# Altium footprint library CommonFootprints_V1.PcbLib: 80 footprints (part 2 of 5)
Each footprint in its own frame and in the unit in brackets; x right, y up, seen from the top. Pads: shape width x height; smd on the part's side, far side on the other; paste and mask are expansions set on the pad; w line width, h text height; cw(c..) or ccw(c..) is an arc to the next point about the centre after c.
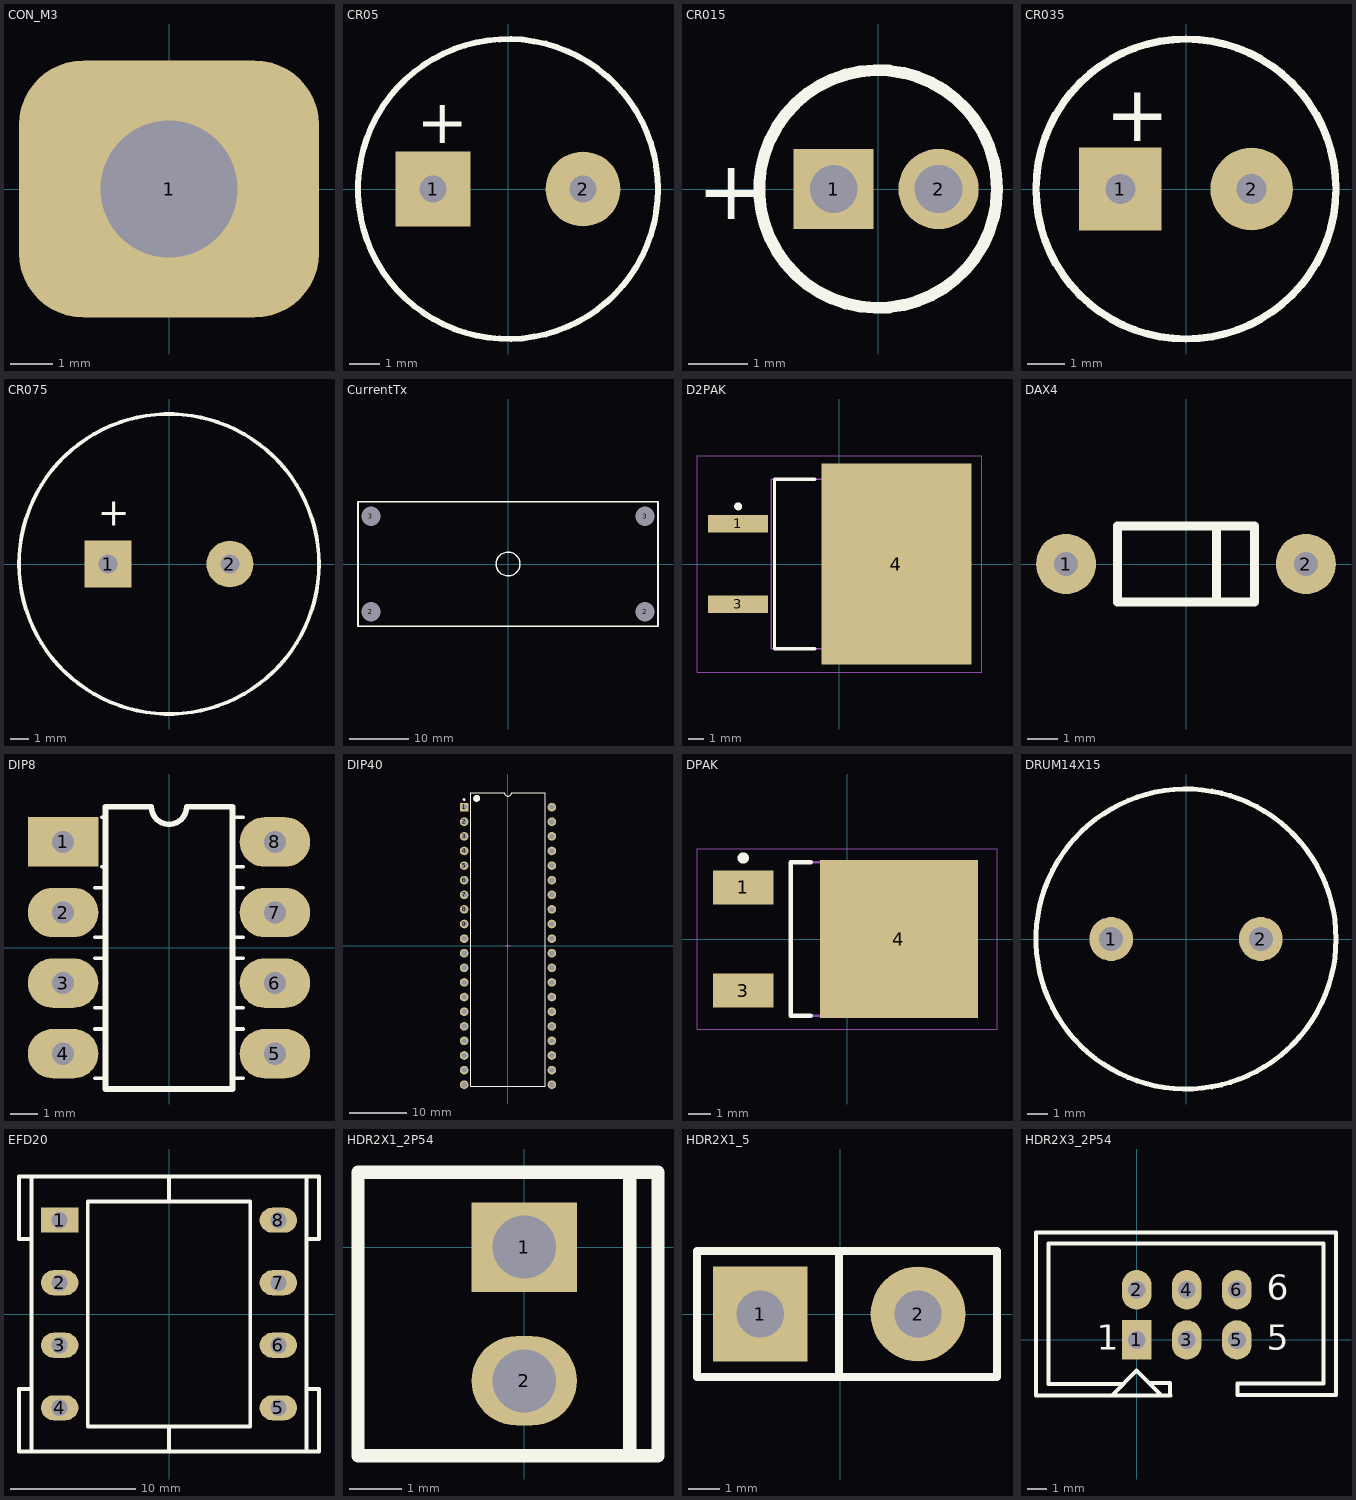
[diagram p1: the footprints below, top view; thin cyan lines are the x and y axes]

## CON_M3 [mm]
pads (1):
  rrect50% 7x6 hole 3.2: 1(0,0)

## CR05 [mm]
pads (2):
  rect 2.5x2.5 hole 0.9: 1(-2.5,0)
  round 2.5 hole 0.9: 2(2.5,0)
Top Overlay:
  circle w0.2: c0,0 r5
  text "+" at -3.048,1.524 h1.5

## CR015 [mm]
pads (2):
  rect 1.35x1.35 hole 0.8: 1(-0.75,0)
  round 1.35 hole 0.8: 2(1.016,0)
Top Overlay:
  circle w0.2: c0,0 r2
  text "+" at -3.048,-0.508 h1

## CR035 [mm]
pads (2):
  rect 2.2x2.2 hole 0.8: 1(-1.75,0)
  round 2.2 hole 0.8: 2(1.75,0)
Top Overlay:
  circle w0.2: c0,0 r4
  text "+" at -2.159,1.27 h1.5
3D body: height 0.25, standoff 0, extent -4.572,4.064 -4.572,4.064
3D body: height 25, standoff 0, extent -4,-3.997 4,3.997

## CR075 [mm]
pads (2):
  rect 2.5x2.5 hole 1: 1(-3.25,0)
  round 2.5 hole 1: 2(3.25,0)
Top Overlay:
  circle w0.2: c0,0 r8
  text "+" at -3.81,2.032 h1.5
3D body "STL@%STL@%STL@%U1-GG.stp": height 19.76, standoff -4.98, extent -8.013,-8.001 8.013,8.001

## CurrentTx [mm]
pads (4):
  round 1.524 hole 3.2: 2(-23,-8) 2(23,-8) 3(-23,8) 3(23,8)
Top Overlay:
  circle w0.254: c0,0 r2
  lines w0.254: -25.146,-10.414 -25.146,10.414 25.146,10.414 25.146,-10.414 -25.146,-10.414

## D2PAK [mm] "D2-PAK, 3-Pads, Body 7.95x8.71mm (max), IPC Low Density"
height 4.9
pads (3):
  rect 3.8x1.1 smd: 1(-6.4,2.54) 3(-6.4,-2.54)
  rect 9.5x12.7 smd: 4(3.6,0)
Top Overlay:
  circle w0.25: c-6.4,3.64 r0.125
  lines w0.2: -1.55,-5.35 -4.1,-5.35 -4.1,5.35 -1.55,5.35
Mechanical 13:
  lines w0.1: -4.3,-5.35 5.4,-5.35 5.4,5.35 -4.3,5.35 -4.3,-5.35
Mechanical 15:
  lines w0.05: -9,-6.85 9,-6.85 9,6.85 -9,6.85 -9,-6.85
  lines w0.1: -0.5,0 0.5,0 ; 0,-0.5 0,0.5
3D body: height 4.9, standoff 0, extent -4.3,-5.35 5.4,5.35

## DAX4 [mm]
pads (2):
  round 2.007 hole 0.8: 1(-4,0) 2(4,0)
Top Overlay:
  lines w0.305: 1.016,-1.27 1.016,1.27 ; -2.286,-1.27 -2.286,1.27 2.286,1.27 2.286,-1.27 -2.286,-1.27

## DIP8 [mm]
pads (8):
  rect 2.54x1.778 hole 0.8: 1(-3.81,3.81)
  oval 2.54x1.778 hole 0.8: 2(-3.81,1.27) 3(-3.81,-1.27) 4(-3.81,-3.81) 5(3.81,-3.81) 6(3.81,-1.27) 7(3.81,1.27) 8(3.81,3.81)
Top Overlay:
  lines w0.127: -2.667,-4.699 -2.286,-4.699 ; -2.667,-2.921 -2.286,-2.921 ; -2.667,-2.159 -2.286,-2.159 ; -2.667,-0.381 -2.286,-0.381 ; -2.667,0.381 -2.286,0.381 ; -2.667,2.159 -2.286,2.159 ; -2.413,2.921 -2.286,2.921 ; -2.413,4.699 -2.286,4.699 ; 2.286,-4.699 2.667,-4.699 ; 2.286,-2.921 2.667,-2.921 ; 2.286,-2.159 2.667,-2.159 ; 2.286,-0.381 2.667,-0.381 ; 2.286,0.381 2.667,0.381 ; 2.286,2.159 2.667,2.159 ; 2.286,2.921 2.667,2.921 ; 2.286,4.699 2.667,4.699
  lines w0.203: -2.286,-5.08 -2.286,5.08 -0.635,5.08 ccw(c0,5.08) 0.635,5.08 2.286,5.08 2.286,-5.08 -2.286,-5.08

## DIP40 [mm] "DIP, 40-Leads, Row Spacing 15.24mm, Pitch 2.54mm, Body 51.8x13.5mm"
height 6.35
pads (40):
  rect 1.5x1.5 hole 0.9: 1(-7.62,24.13)
  round 1.5 hole 0.9: 2(-7.62,21.59) 3(-7.62,19.05) 4(-7.62,16.51) 5(-7.62,13.97) 6(-7.62,11.43) 7(-7.62,8.89) 8(-7.62,6.35) 9(-7.62,3.81) 10(-7.62,1.27) 11(-7.62,-1.27) 12(-7.62,-3.81) 13(-7.62,-6.35) 14(-7.62,-8.89) 15(-7.62,-11.43) 16(-7.62,-13.97) 17(-7.62,-16.51) 18(-7.62,-19.05) 19(-7.62,-21.59) 20(-7.62,-24.13) 21(7.62,-24.13) 22(7.62,-21.59) 23(7.62,-19.05) 24(7.62,-16.51) 25(7.62,-13.97) 26(7.62,-11.43) 27(7.62,-8.89) 28(7.62,-6.35) 29(7.62,-3.81) 30(7.62,-1.27) 31(7.62,1.27) 32(7.62,3.81) 33(7.62,6.35) 34(7.62,8.89) 35(7.62,11.43) 36(7.62,13.97) 37(7.62,16.51) 38(7.62,19.05) 39(7.62,21.59) 40(7.62,24.13)
Top Overlay:
  circle w0.25: c-7.62,25.43 r0.125
  circle w0.6: c-5.45,25.65 r0.3
  lines w0.2: -6.45,-24.384 -6.45,26.65 -0.635,26.65 ccw(c0,26.65) 0.635,26.65 6.45,26.65 6.45,-24.384 -6.45,-24.384
Mechanical 15:
  lines w0.1: -0.5,0 0.5,0 ; 0,-0.5 0,0.5
3D body "User Library-7seg-3.STEP": height 8, standoff -3.76, extent -9.525,1.47 9.525,26.47
3D body "User Library-7seg-3.STEP": height 8, standoff -3.76, extent -9.525,-23.93 9.525,1.07

## DPAK [mm] "TO228P970-3N"
height 2.4
pads (3):
  rect 2.7x1.5 smd: 1(-4.6,2.29) 3(-4.6,-2.29)
  rect 7x7 smd: 4(2.3,0)
Top Overlay:
  circle w0.25: c-4.6,3.59 r0.125
  lines w0.2: -1.6,-3.4 -2.5,-3.4 -2.5,3.4 -1.6,3.4
Mechanical 13:
  lines w0.1: -2.5,-3.4 -2.5,3.4 3.8,3.4 3.8,-3.4 -2.5,-3.4
Mechanical 15:
  lines w0.05: -6.65,-4 -6.65,4 6.65,4 6.65,-4 -6.65,-4
  lines w0.1: -0.5,0 0.5,0 ; 0,-0.5 0,0.5
3D body: height 2.4, standoff 0, extent -2.5,-3.4 3.8,3.4

## DRUM14X15 [mm]
height 15
pads (2):
  round 2.2 hole 1.2: 1(-3.75,0) 2(3.75,0)
Top Overlay:
  circle w0.254: c0,0 r7.52
3D body: height 15, standoff 0, extent -6.35,-6.35 6.35,6.35

## EFD20 [mm]
pads (8):
  rect 3x2 hole 1.3: 1(-8.75,7.5)
  oval 3x2 hole 1.3: 2(-8.75,2.5) 3(-8.75,-2.5) 4(-8.75,-7.5) 5(8.75,-7.5) 6(8.75,-2.5) 7(8.75,2.5) 8(8.75,7.5)
Top Overlay:
  lines w0.305: -11,-11 -11,11 ; -11,-6 -12,-6 -12,-11 12,-11 12,-6 11,-6 ; -11,6 -12,6 -12,11 12,11 12,6 11,6 ; 0,-11 0,-9 ; 0,9 0,11 ; 11,-11 11,11 ; -6.5,-9 6.5,-9 6.5,9 -6.5,9 -6.5,-9

## HDR2X1_2P54 [mm] "Polarised Header 2 way"
height 8.5
pads (2):
  rect 2x1.7 hole 1.2: 1(0,0)
  oval 2x1.7 hole 1.2: 2(0,-2.54)
Top Overlay:
  lines w0.254: 2,-3.96 2,1.42 ; -3.16,-3.96 2.54,-3.96 2.54,1.42 -3.16,1.42 -3.16,-3.96
3D body "2PIN.STEP": height 7.39, standoff -6.2, extent -3.302,-3.64 3.175,1.44

## HDR2X1_5 [mm]
pads (2):
  rect 3x3 hole 1.5: 1(-2.54,0)
  round 3 hole 1.5: 2(2.46,0)
Top Overlay:
  lines w0.254: -0.04,-2 -0.04,2 ; -4.54,-2 -4.54,2 4.96,2 4.96,-2 -4.54,-2

## HDR2X3_2P54 [mm] "IDC 3X2 Way 2.54 pitch"
height 9.3
pads (6):
  rect 1.5x2 hole 0.9: 1(0,0)
  oval 1.5x2 hole 0.9 paste+0: 2(0,2.54)
  oval 1.5x2 hole 0.9: 3(2.54,0) 4(2.54,2.54) 5(5.08,0) 6(5.08,2.54)
Top Overlay:
  lines w0.2: -5.1,-2.8 -5.1,5.45 ; -4.465,4.89 -4.465,-2.24 -0.69,-2.24 ; -4.455,4.89 9.465,4.89 9.465,-2.2 ; -1.26,-2.81 0,-1.55 1.26,-2.81 ; 0.635,-2.185 1.7,-2.185 1.7,-2.8 ; 1.72,-2.82 -5.1,-2.82 -5.1,5.45 ; 5.1,-2.3 5.1,-2.8 10.1,-2.8 ; 5.1,-2.2 9.415,-2.2 ; 10.1,-2.75 10.1,5.45 ; -5.1,5.45 10.1,5.45 ; 10.1,-2.8 10.1,5.45 ; 10.1,-2.8 10.1,5.45
  text "1" at -2.032,-0.508 h1.27
  text "5" at 6.604,-0.508 h1.27
  text "6" at 6.604,2.032 h1.27
3D body "IDC3X2.STEP": height 9.1, standoff -3.1, extent -5.07,-3.175 10.17,6.275